# Altium footprint library Connectors Pad Lib.PcbLib: 70 footprints (part 1 of 5)
Each footprint in its own frame and in the unit in brackets; x right, y up, seen from the top. Pads: shape width x height; smd on the part's side, far side on the other; paste and mask are expansions set on the pad; w line width, h text height; cw(c..) or ccw(c..) is an arc to the next point about the centre after c.
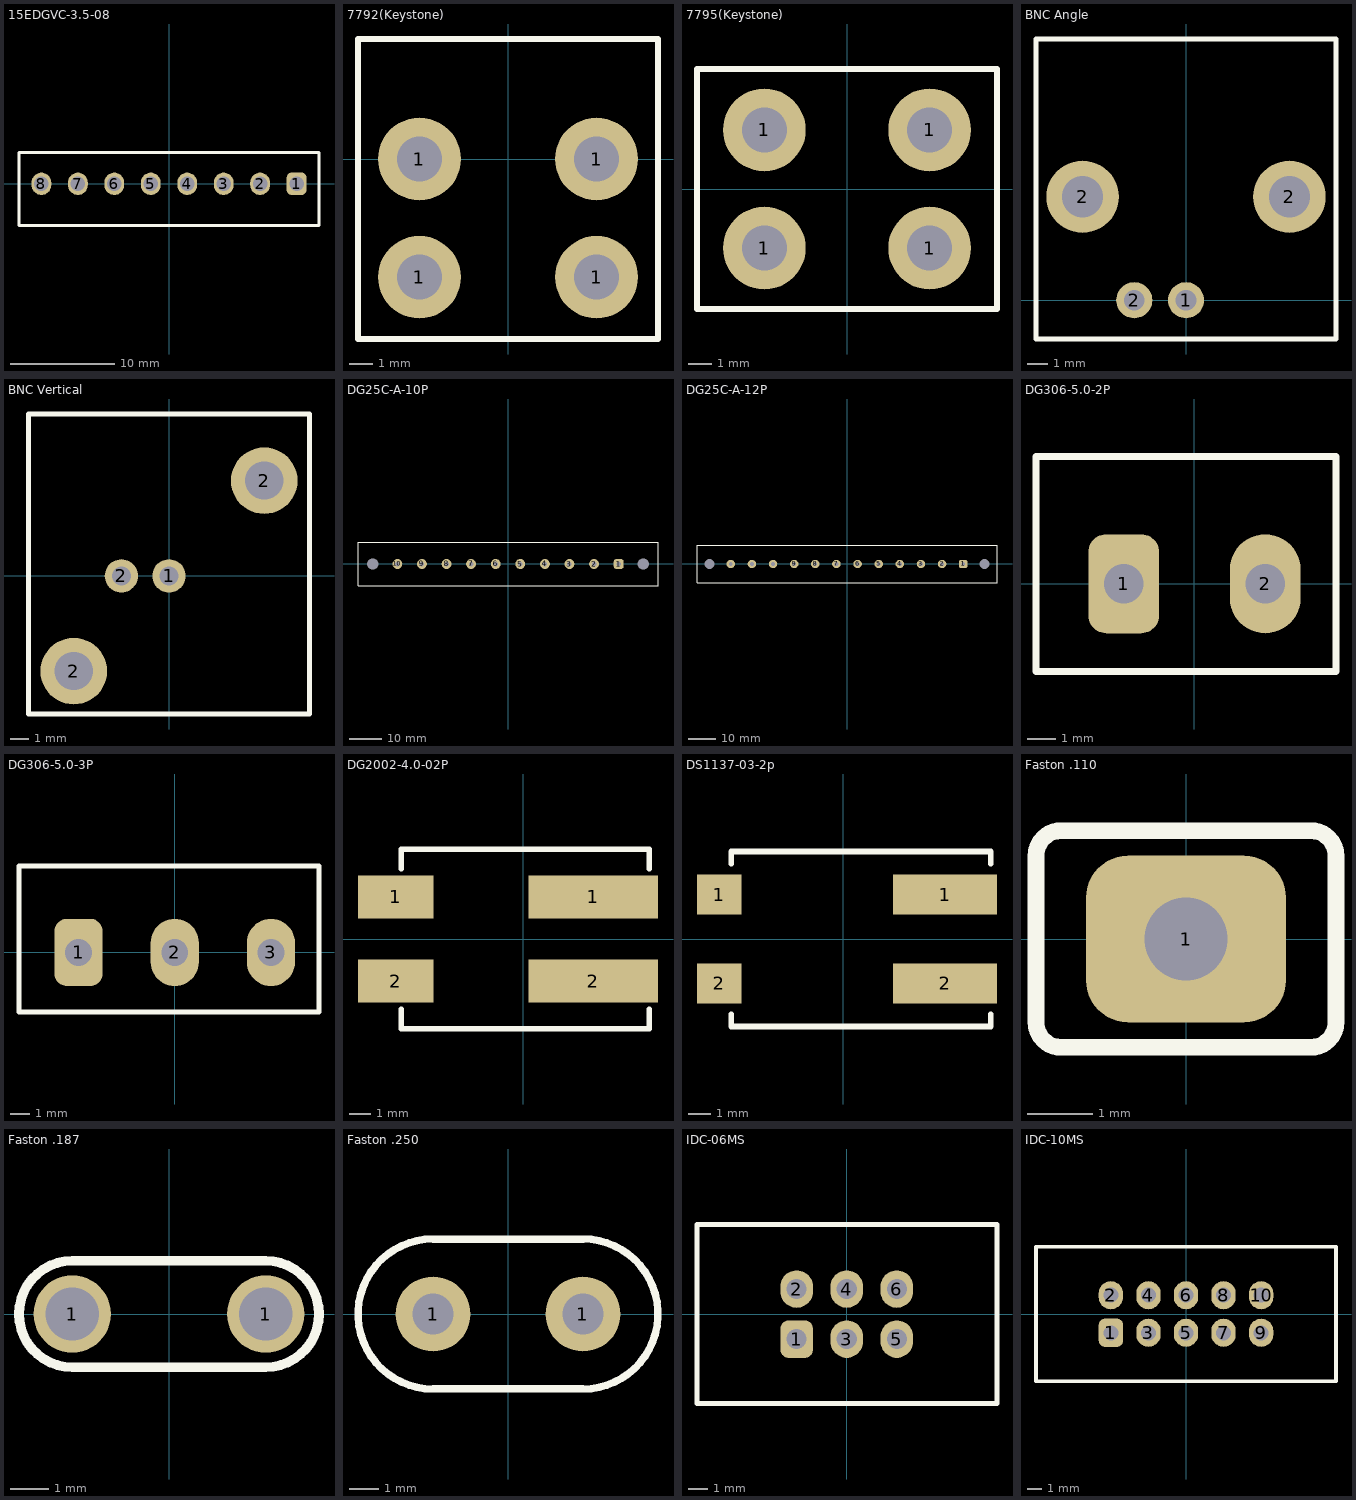
[diagram p0: the footprints below, top view; thin cyan lines are the x and y axes]

## 15EDGVC-3.5-08 [mil] "PCB Vertical Connector 8-Pin"
pads (8):
  rrect50% 75x85 hole 55: 1(482.28,0)
  oval 75x85 hole 55: 2(344.49,0) 3(206.69,0) 4(68.9,0) 5(-68.9,0) 6(-206.69,0) 7(-344.49,0) 8(-482.28,0)
Top Overlay:
  lines w10: -566.93,-157.48 566.93,-157.48 566.93,118.11 -566.93,118.11 -566.93,-157.48
3D body "15EDGVC-3.5-8P-1.STEP": height 362.2, standoff -133.86, extent -566.93,-157.48 566.93,118.11

## 7792(Keystone) [mm] "Keystone"
pads (4):
  round 3.5 hole 1.9: 1(-3.75,-5) 1(-3.75,0) 1(3.75,-5) 1(3.75,0)
Top Overlay:
  lines w0.254: -6.35,-7.62 -6.35,5.08 6.35,5.08 6.35,-7.62 -6.35,-7.62
3D body "keystone-PN7792.step": height 7.92, standoff -5.08, extent -4.817,-6.429 4.817,5.08

## 7795(Keystone) [mm] "Keystone"
pads (4):
  round 3.5 hole 1.9: 1(-3.5,-2.5) 1(-3.5,2.5) 1(3.5,-2.5) 1(3.5,2.5)
Top Overlay:
  lines w0.254: -6.35,-5.08 -6.35,5.08 6.35,5.08 6.35,-5.08 -6.35,-5.08
3D body "keystone-PN7795.STEP": height 6.43, standoff -4.75, extent -4.441,-3.937 4.441,3.937

## BNC Angle [mil] "BNC Angle Jack PCB mount"
pads (4):
  round 70 hole 40: 1(0,0) 2(-100,0)
  round 140 hole 80: 2(-200,200) 2(200,200)
Top Overlay:
  lines w10: -290,-75 -290,505 290,505 290,-75 -290,-75
3D body "BNC Angle Jack PCB mount.step": height 630, standoff -157, extent -290.5,-75 290.5,1325

## BNC Vertical [mil] "BNC Vertical Jack PCB mount"
pads (4):
  round 70 hole 40: 1(0,0) 2(-100,0)
  round 140 hole 80: 2(-200,-200) 2(200,200)
Top Overlay:
  lines w10: -295,-290 295,-290 295,340 -295,340 -295,-290
3D body "BNC Vertical Jack PCB mount.step": height 1400, standoff -225, extent -290.5,-288 290.5,336.76

## DG25C-A-10P [mil] "PCB Vertical Connector 10-Pin"
pads (12):
  round 0 hole 140 unplated: 0(-1650,0) 0(1650,0)
  rrect50% 120x120 hole 55: 1(1350,0)
  round 120 hole 55: 2(1050,0) 3(750,0) 4(450,0) 5(150,0) 6(-150,0) 7(-450,0) 8(-750,0) 9(-1050,0) 10(-1350,0)
Top Overlay:
  lines w10: -1830,-266 -1830,266 1830,266 1830,-266 -1830,-266
3D body "DG25C-A-10P-13-00A(H).STEP": height 586.61, standoff -192.91, extent -1829.06,-265.74 1830,265.75

## DG25C-A-12P [mil] "PCB Vertical Connector 12-Pin"
pads (14):
  round 0 hole 140 unplated: 0(-1950,0) 0(1950,0)
  rrect50% 120x120 hole 55: 1(1650,0)
  round 120 hole 55: 2(1350,0) 3(1050,0) 4(750,0) 5(450,0) 6(150,0) 7(-150,0) 8(-450,0) 9(-750,0) 10(-1050,0) 11(-1350,0) 12(-1650,0)
Top Overlay:
  lines w10: -2130,-266 -2130,266 2130,266 2130,-266 -2130,-266
3D body "DG25C-A-10P-13-00A(H).STEP": height 586.61, standoff -192.91, extent -1829.06,-265.74 1830,265.75

## DG306-5.0-2P [mm] "Degson PCB Screw Terminal Blocks"
pads (2):
  rrect50% 2.5x3.5 hole 1.4: 1(-2.5,0)
  oval 2.5x3.5 hole 1.4: 2(2.5,0)
Top Overlay:
  lines w0.254: -5.6,-3.1 5,-3.1 5,4.5 -5.6,4.5 -5.6,-3.1
3D body "DG301-5.0-2P12.STEP": height 10, standoff -4.16, extent -5.6,-3.1 5,4.5

## DG306-5.0-3P [mm] "Degson PCB Screw Terminal Blocks"
pads (3):
  rrect50% 2.5x3.5 hole 1.4: 1(-5,0)
  oval 2.5x3.5 hole 1.4: 2(0,0) 3(5,0)
Top Overlay:
  lines w0.254: -8.1,-3.1 -8.1,4.5 7.5,4.5 7.5,-3.1 -8.1,-3.1
3D body "DG301-5.0-3P12.STEP": height 10, standoff -4.16, extent -8.1,-3.1 7.5,4.5

## DG2002-4.0-02P [mm] "2.0mm Pitch Disconnectable Crimp Style Connector, Body 7.9mm x 8.6mm"
height 5.5
pads (4):
  rect 3.5x2 smd paste+0 mask+0: 1(-5.9,1.95) 2(-5.9,-1.95)
  rect 6x2 smd paste+0 mask+0: 1(3.25,1.95) 2(3.25,-1.95)
Top Overlay:
  lines w0.254: -5.65,-3.25 -5.65,-4.15 5.85,-4.15 5.85,-3.25 ; -5.65,3.25 -5.65,4.15 5.85,4.15 5.85,3.25
3D body "DG2002-4.0-02P.STEP": height 4.1, standoff 0, extent -7.35,-4.15 5.85,4.15

## DS1137-03-2p [mm]
height 5.5
pads (4):
  rect 2x1.8 smd: 1(-5.6,2) 2(-5.6,-2)
  rect 4.69x1.8 smd: 1(4.595,2) 2(4.595,-2)
Top Overlay:
  lines w0.254: -5.05,-3.4 -5.05,-3.95 6.65,-3.95 6.65,-3.4 ; -5.05,3.4 -5.05,3.95 6.65,3.95 6.65,3.4

## Faston .110 [mil] "Faston .110  Series , Straight, PCB, 2.8 x 0.8mm"
pads (1):
  rrect50% 120x100 hole 50: 1(0,0)
Top Overlay:
  lines w10: -90,-50 ccw(c-75,-50) -75,-65 75,-65 ccw(c75,-50) 90,-50 90,50 ccw(c75,50) 75,65 -75,65 ccw(c-75,50) -90,50 -90,-50
3D body "FASTON Straight Mount PCB Terminal, 2.8 x 0.51mm.step": height 343, standoff -146.9, extent -84.6,-15.75 84.61,15.75

## Faston .187 [mil] "Faston .187  Series , Straight, PCB, 4.75 x 0.8mm"
pads (2):
  round 80 hole 55: 1(-100,0) 1(100,0)
Top Overlay:
  lines w10: -100,-55 cw(c-100,0) -100,55 100,55 cw(c100,0) 100,-55 -100,-55
3D body "FASTON Straight Mount PCB Terminal, 4.8 x 0.8mm.step": height 368.11, standoff -175.2, extent -124.01,-15 124.02,16.5

## Faston .250 [mil] "Faston .250  Series , Straight, PCB, 6.35 x 0.8mm"
pads (2):
  round 100 hole 55: 1(-100,0) 1(100,0)
Top Overlay:
  lines w10: -100,-100 cw(c-100,0) -100,100 100,100 cw(c100,0) 100,-100 -100,-100
3D body "FASTON Straight Mount PCB Terminal, 6.35 x 0.8mm.step": height 397.48, standoff -153.7, extent -157.48,-15 157.48,16.5

## IDC-06MS [mil]
pads (6):
  rrect50% 65x75 hole 40: 1(-100,-50.2)
  oval 65x75 hole 40: 2(-100,49.8) 3(0,-50.2) 4(0,49.8) 5(100,-50.2) 6(100,49.8)
Top Overlay:
  lines w10: -299.21,-179.13 300.2,-179.13 300.2,179.13 -299.21,179.13 -299.21,-179.13
3D body "IDC-06MS.step": height 354.33, standoff -118.11, extent -299.61,-179.56 299.6,178.71

## IDC-10MS [mil]
pads (10):
  rrect50% 65x75 hole 40: 1(-200,-50)
  oval 65x75 hole 40: 2(-200,50) 3(-100,-50) 4(-100,50) 5(0,-50) 6(0,50) 7(100,-50) 8(100,50) 9(200,-50) 10(200,50)
Top Overlay:
  lines w10: -399.61,-179.13 399.61,-179.13 399.61,179.13 -399.61,179.13 -399.61,-179.13
3D body "IDC-10MS.step": height 354.33, standoff -118.11, extent -399.61,-179.13 399.6,179.13